# Altium footprint library Microcontroller.PcbLib: 6 footprints
Each footprint in its own frame and in the unit in brackets; x right, y up, seen from the top. Pads: shape width x height; smd on the part's side, far side on the other; paste and mask are expansions set on the pad; w line width, h text height; cw(c..) or ccw(c..) is an arc to the next point about the centre after c.
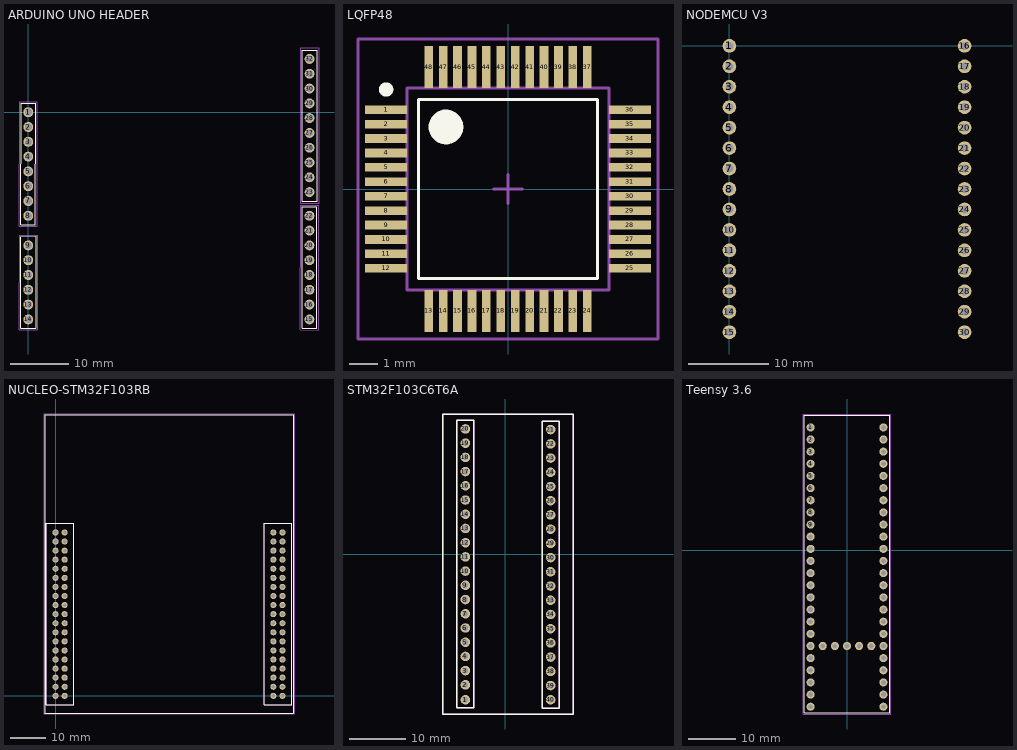
[diagram p0: the footprints below, top view; thin cyan lines are the x and y axes]

## ARDUINO UNO HEADER [mm]
pads (32):
  round 1.7 hole 1.2: 1(0,0) 2(0,-2.54) 3(0,-5.08) 4(0,-7.62) 5(0,-10.16) 6(0,-12.7) 7(0,-15.24) 8(0,-17.78) 9(0,-22.86) 10(0,-25.4) 11(0,-27.94) 12(0,-30.48) 13(0,-33.02) 14(0,-35.56) 15(48.26,-35.56) 16(48.26,-33.02) 17(48.26,-30.48) 18(48.26,-27.94) 19(48.26,-25.4) 20(48.26,-22.86) 21(48.26,-20.32) 22(48.26,-17.78) 23(48.285,-13.717) 24(48.285,-11.177) 25(48.285,-8.637) 26(48.285,-6.097) 27(48.285,-3.557) 28(48.285,-1.017) 29(48.285,1.523) 30(48.285,4.063) 31(48.285,6.603) 32(48.285,9.143)
Top Overlay:
  lines w0.2: -1.263,-21.352 -1.308,-37.099 1.295,-37.121 1.25,-21.33 -1.261,-21.344 ; -1.236,1.516 -1.254,-19.304 1.231,-19.304 1.255,1.528 -1.228,1.549 ; 47.007,-16.258 47.005,-37.066 49.496,-37.071 49.504,-16.258 47.016,-16.264 ; 47,-15.276 49.577,-15.243 49.577,10.665 47.066,10.665 47,-15.276
Mechanical 15:
  lines w0.1: 46.778,-15.955 46.714,-37.344 49.785,-37.387 49.742,-15.976 46.821,-15.976 ; -1.596,-37.372 1.541,-37.372 1.494,-21.092 -1.486,-21.089 -1.596,-37.372 ; -1.557,-19.61 1.56,-19.596 1.56,1.757 1.557,1.759 1.557,1.814 -1.491,1.814 -1.557,-19.61 ; 46.76,-15.613 49.902,-15.613 49.902,11.025 46.76,11.025 46.76,-15.613
3D body "6-Pin Header - Female - 2.54mm.step": height 5, standoff -3, extent -1.25,-37.08 1.25,-21.34
3D body "8-Pin Header - Female - 2.54mm.step": height 5, standoff -3, extent -1.25,-19.3 1.25,1.52
3D body "8-Pin Header - Female - 2.54mm.step": height 5, standoff -3, extent 47.01,-37.08 49.51,-16.26
3D body "10-Pin Header - Female - 2.54mm.step": height 5, standoff -3, extent 47.066,-15.256 49.566,10.644

## LQFP48 [mm] "TSQFP, 48-Leads, Body 7,00x7,00mm, Pitch 0,50mm, IPC Medium Density"
height 1.6
pads (48):
  rect 1.45x0.3 smd mask+0.05: 1(-4.225,2.75) 2(-4.225,2.25) 3(-4.225,1.75) 4(-4.225,1.25) 5(-4.225,0.75) 6(-4.225,0.25) 7(-4.225,-0.25) 8(-4.225,-0.75) 9(-4.225,-1.25) 10(-4.225,-1.75) 11(-4.225,-2.25) 12(-4.225,-2.75) 25(4.225,-2.75) 26(4.225,-2.25) 27(4.225,-1.75) 28(4.225,-1.25) 29(4.225,-0.75) 30(4.225,-0.25) 31(4.225,0.25) 32(4.225,0.75) 33(4.225,1.25) 34(4.225,1.75) 35(4.225,2.25) 36(4.225,2.75)
  rect 0.3x1.45 smd mask+0.05: 13(-2.75,-4.225) 14(-2.25,-4.225) 15(-1.75,-4.225) 16(-1.25,-4.225) 17(-0.75,-4.225) 18(-0.25,-4.225) 19(0.25,-4.225) 20(0.75,-4.225) 21(1.25,-4.225) 22(1.75,-4.225) 23(2.25,-4.225) 24(2.75,-4.225) 37(2.75,4.225) 38(2.25,4.225) 39(1.75,4.225) 40(1.25,4.225) 41(0.75,4.225) 42(0.25,4.225) 43(-0.25,4.225) 44(-0.75,4.225) 45(-1.25,4.225) 46(-1.75,4.225) 47(-2.25,4.225) 48(-2.75,4.225)
Top Overlay:
  circle w0.6: c-2.15,2.15 r0.3
  circle w0.25: c-4.225,3.45 r0.125
  lines w0.1: -3.1,-3.1 3.1,-3.1 3.1,3.1 -3.1,3.1 -3.1,-3.1
Mechanical 13:
  circle w0.1: c-2.127,2.172 r0.5
  lines w0.1: -3.5,-3.5 3.5,-3.5 3.5,3.5 -3.5,3.5 -3.5,-3.5
Mechanical 15:
  lines w0.1: -0.5,0 0.5,0 ; 0,-0.5 0,0.5 ; -5.2,-5.2 5.2,-5.2 5.2,5.2 -5.2,5.2 -5.2,-5.2
3D body "LQFP48.step": height 1.6, standoff 0, extent -4.5,-4.5 4.5,4.5

## NODEMCU V3 [mm] "NodeMCU V3 ESP8266"
pads (31):
  round 1.7 hole 1: 1(0,0) 2(0,-2.54) 3(0,-5.08) 4(0,-7.62) 5(0,-10.16) 6(0,-12.7) 7(0,-15.24) 8(0,-17.78) 9(0,-20.32) 10(0,-22.86) 11(0,-25.4) 12(0,-27.94) 13(0,-30.48) 14(0,-33.02) 15(0,-35.56) 16(29.21,0) 16(29.21,0) 17(29.21,-2.54) 18(29.21,-5.08) 19(29.21,-7.62) 20(29.21,-10.16) 21(29.21,-12.7) 22(29.21,-15.24) 23(29.21,-17.78) 24(29.21,-20.32) 25(29.21,-22.86) 26(29.21,-25.4) 27(29.21,-27.94) 28(29.21,-30.48) 29(29.21,-33.02) 30(29.21,-35.56)
3D body "Lolin NodeMCU ESP8266 V3.STEP": height 4.6, standoff -8.54, extent -1.274,-51.072 30.226,8.908

## NUCLEO-STM32F103RB [mm]
pads (76):
  round 1.7 hole 1 mask+0.102: 1(0,45.72) 2(2.54,45.72) 3(0,43.18) 4(2.54,43.18) 5(0,40.64) 6(2.54,40.64) 7(0,38.1) 8(2.54,38.1) 9(0,35.56) 10(2.54,35.56) 11(0,33.02) 12(2.54,33.02) 13(0,30.48) 14(2.54,30.48) 15(0,27.94) 16(2.54,27.94) 17(0,25.4) 18(2.54,25.4) 19(0,22.86) 20(2.54,22.86) 21(0,20.32) 22(2.54,20.32) 23(0,17.78) 24(2.54,17.78) 25(0,15.24) 26(2.54,15.24) 27(0,12.7) 28(2.54,12.7) 29(0,10.16) 30(2.54,10.16) 31(0,7.62) 32(2.54,7.62) 33(0,5.08) 34(2.54,5.08) 35(0,2.54) 36(2.54,2.54) 37(0,0) 38(2.54,0) 39(60.96,45.72) 40(63.5,45.72) 41(60.96,43.18) 42(63.5,43.18) 43(60.96,40.64) 44(63.5,40.64) 45(60.96,38.1) 46(63.5,38.1) 47(60.96,35.56) 48(63.5,35.56) 49(60.96,33.02) 50(63.5,33.02) 51(60.96,30.48) 52(63.5,30.48) 53(60.96,27.94) 54(63.5,27.94) 55(60.96,25.4) 56(63.5,25.4) 57(60.96,22.86) 58(63.5,22.86) 59(60.96,20.32) 60(63.5,20.32) 61(60.96,17.78) 62(63.5,17.78) 63(60.96,15.24) 64(63.5,15.24) 65(60.96,12.7) 66(63.5,12.7) 67(60.96,10.16) 68(63.5,10.16) 69(60.96,7.62) 70(63.5,7.62) 71(60.96,5.08) 72(63.5,5.08) 73(60.96,2.54) 74(63.5,2.54) 75(60.96,0) 76(63.5,0)
Top Overlay:
  lines w0.254: -3.048,-4.826 -3.048,78.613 66.548,78.613 66.548,-4.826 -3.048,-4.826 ; -2.54,-2.54 5.08,-2.54 5.08,48.26 -2.54,48.26 -2.54,-2.54 ; 58.42,-2.54 66.04,-2.54 66.04,48.26 58.42,48.26 58.42,-2.54
Bottom Overlay:
  lines w0.2: -1.397,-1.524 -1.27,47.244 3.81,47.244 3.81,-1.524 -1.397,-1.524 ; 59.69,-1.397 64.77,-1.397 64.77,47.244 59.69,47.244 59.69,-1.397
Mechanical 3:
  lines w0.254: -3.302,-5.08 -3.302,78.867 66.802,78.867 66.802,-5.08 -3.302,-5.08 ; -2.54,-2.54 5.08,-2.54 5.08,48.26 -2.54,48.26 -2.54,-2.54 ; 58.42,-2.54 66.04,-2.54 66.04,48.26 58.42,48.26 58.42,-2.54
3D body "38-Pin Header - Female - Double - 2.54mm.step": height 8.5, standoff -3, extent 59.75,-1.52 64.75,47.24
3D body "38-Pin Header - Female - Double - 2.54mm.step": height 8.5, standoff -3, extent -1.21,-1.52 3.79,47.24
3D body "NUCLEO-60-F401.STEP": height 21.48, standoff 1.22, extent -3.302,-5.152 66.698,78.813

## STM32F103C6T6A [mm]
pads (40):
  round 1.7 hole 1 mask+0.102: 1(-7.112,-26.035) 2(-7.112,-23.368) 3(-7.112,-20.828) 4(-7.112,-18.288) 5(-7.112,-15.748) 6(-7.112,-13.208) 7(-7.112,-10.668) 8(-7.112,-8.128) 9(-7.112,-5.588) 10(-7.112,-3.048) 11(-7.112,-0.508) 12(-7.112,2.032) 13(-7.112,4.572) 14(-7.112,7.112) 15(-7.112,9.652) 16(-7.112,12.192) 17(-7.112,14.732) 18(-7.112,17.272) 19(-7.112,19.812) 20(-7.112,22.352) 21(8.128,22.225) 22(8.128,19.685) 23(8.128,17.145) 24(8.128,14.605) 25(8.128,12.065) 26(8.128,9.525) 27(8.128,6.985) 28(8.128,4.445) 29(8.128,1.905) 30(8.128,-0.635) 31(8.128,-3.175) 32(8.128,-5.715) 33(8.128,-8.255) 34(8.128,-10.795) 35(8.128,-13.335) 36(8.128,-15.875) 37(8.128,-18.415) 38(8.128,-20.955) 39(8.128,-23.495) 40(8.128,-26.035)
Top Overlay:
  lines w0.254: -11.176,-28.575 12.192,-28.575 12.192,25.019 -11.176,25.019 -11.176,-28.575 ; -8.636,-27.432 -8.636,23.876 -5.588,23.876 -5.588,-27.432 -8.636,-27.432 ; 6.604,-27.559 9.652,-27.559 9.652,23.749 6.604,23.749 6.604,-27.559
Mechanical 3:
  lines w0.254: -11.176,-28.575 12.192,-28.575 12.192,25.019 -11.176,25.019 -11.176,-28.575 ; -8.636,-27.432 -8.636,23.876 -5.588,23.876 -5.588,-27.432 -8.636,-27.432 ; 6.604,-27.559 9.652,-27.559 9.652,23.749 6.604,23.749 6.604,-27.559
3D body "20-Pin Header - Male - 2.54mm.step": height 6.05, standoff -5.89, extent 6.858,-27.305 9.398,23.495
3D body "YAAJ_BluePill (1).step": height 14.6, standoff 2.1, extent -10.792,-28.321 11.808,24.679
3D body "20-Pin Header - Male - 2.54mm.step": height 6.05, standoff -5.89, extent -8.382,-27.178 -5.842,23.622

## Teensy 3.6 [mm]
pads (55):
  round 1.7 hole 1: 1(-7.62,25.654) 2(-7.62,23.114) 3(-7.62,20.574) 4(-7.62,18.034) 5(-7.62,15.494) 6(-7.62,12.954) 7(-7.62,10.414) 8(-7.62,7.874) 9(-7.62,5.334) 10(-7.62,2.794) 11(-7.62,0.254) 12(-7.62,-2.286) 13(-7.62,-4.826) 14(-7.62,-7.366) 15(-7.62,-9.906) 16(-7.62,-12.446) 17(-7.62,-14.986) 18(-7.62,-17.526) 19(-7.62,-20.066) 20(-7.62,-22.606) 21(-7.62,-25.146) 22(-7.62,-27.686) 23(-7.62,-30.226) 24(-7.62,-32.766) 24(-7.62,-32.766) 25(7.62,-32.766) 25(7.62,-32.766) 26(7.62,-30.226) 27(7.62,-27.686) 28(7.62,-25.146) 29(7.62,-22.606) 30(7.62,-20.066) 31(7.62,-17.526) 32(7.62,-14.986) 33(7.62,-12.446) 34(7.62,-9.906) 35(7.62,-7.366) 36(7.62,-4.826) 37(7.62,-2.286) 38(7.62,0.254) 39(7.62,2.794) 40(7.62,5.334) 41(7.62,7.874) 42(7.62,10.414) 43(7.62,12.954) 44(7.62,15.494) 45(7.62,18.034) 46(7.62,20.574) 47(7.62,23.114) 48(7.62,25.654) ""(-5.08,-20.066) ""(-2.54,-20.066) ""(0,-20.066) ""(2.54,-20.066) ""(5.08,-20.066)
Top Overlay:
  lines w0.2: -8.89,-34.036 8.89,-34.036 8.89,28.194 -8.89,28.194 -8.89,-34.036
Mechanical 15:
  lines w0.1: -9.144,-34.29 -9.144,28.448 9.144,28.448 9.144,-34.29 -9.144,-34.29
3D body "Teensy 3.5 - 3.6.step": height 7.49, standoff -5.65, extent -8.89,-34.166 8.89,28.194